# Altium footprint library Molex FFC - FPC Connectors (SMT).PcbLib: 638 footprints (part 6 of 40)
Each footprint in its own frame and in the unit in brackets; x right, y up, seen from the top. Pads: shape width x height; smd on the part's side, far side on the other; paste and mask are expansions set on the pad; w line width, h text height; cw(c..) or ccw(c..) is an arc to the next point about the centre after c.
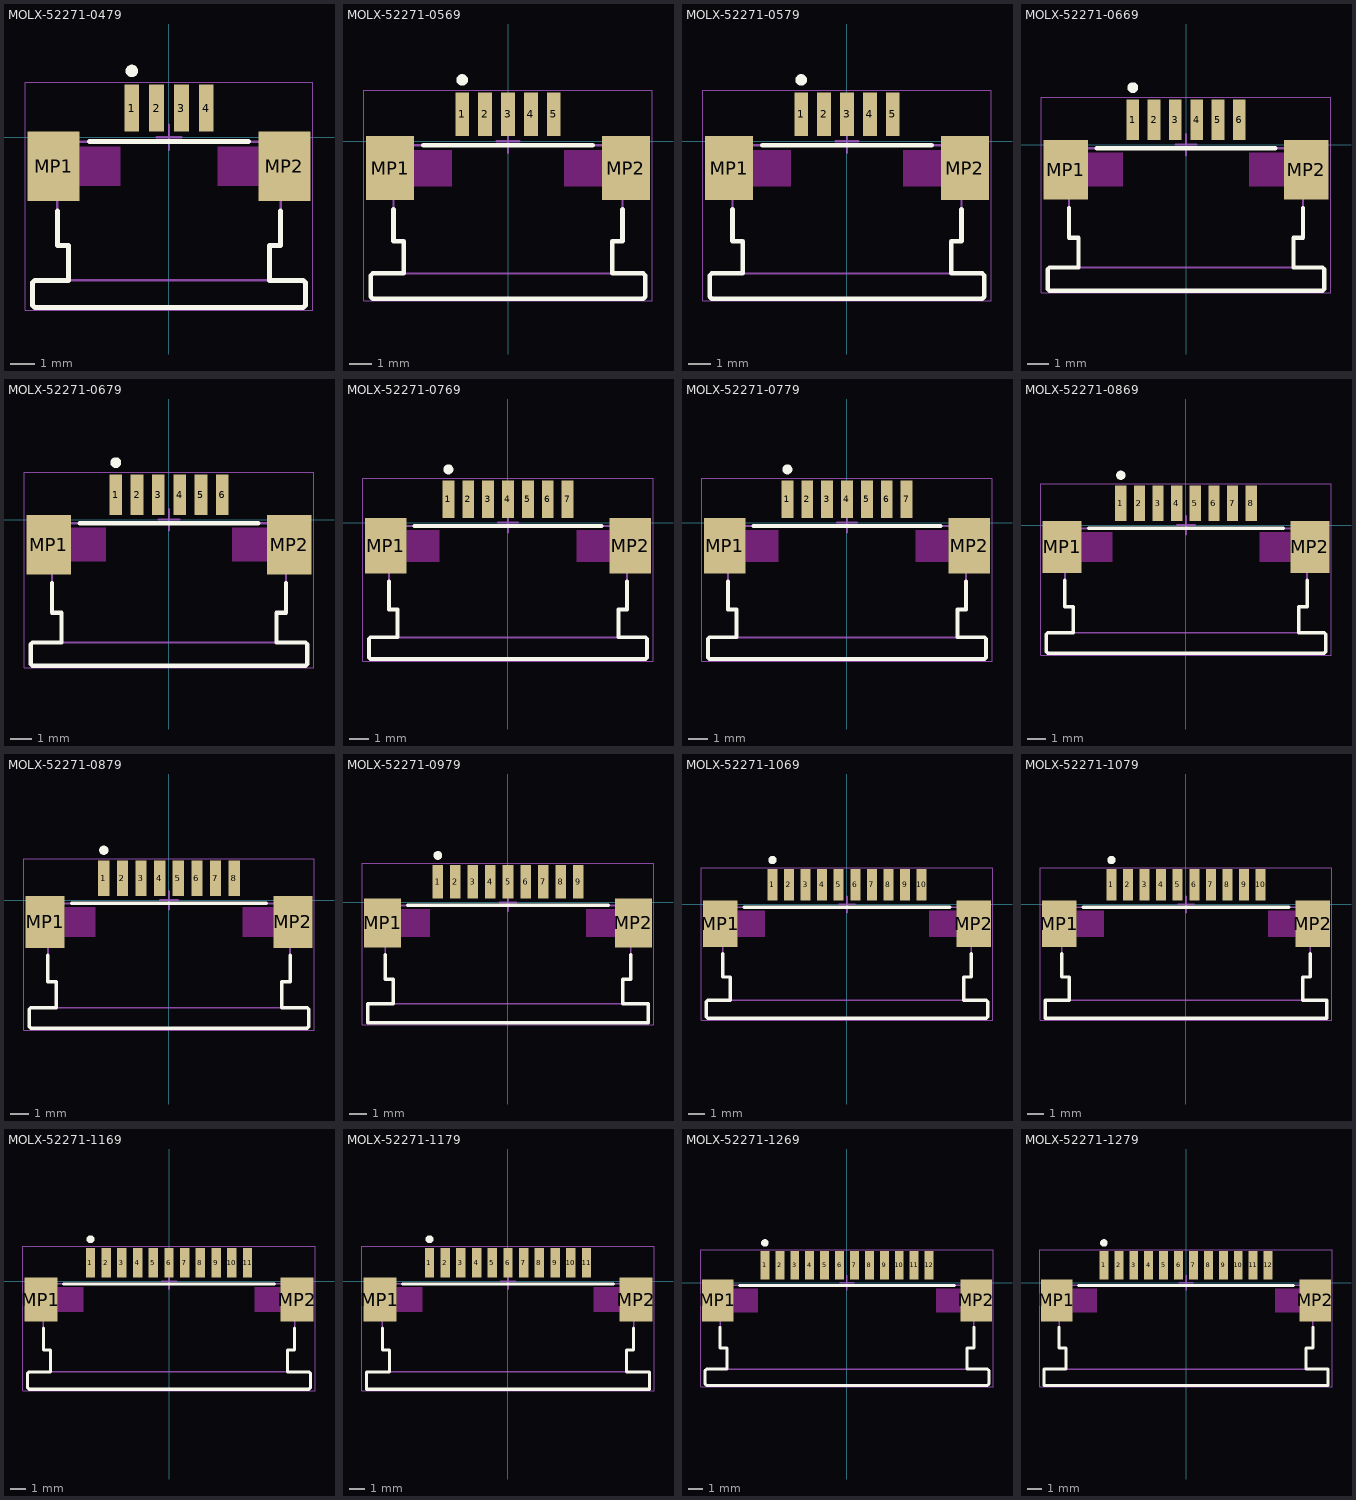
[diagram p5: the footprints below, top view; thin cyan lines are the x and y axes]

## MOLX-52271-0479 [mm] "FPC Connector, 4-Leads, Right Angle, Pitch 1.0 mm, Mated Height 3.0 mm, SMT"
height 3
pads (6):
  rect 0.6x1.9 smd: 1(-1.5,1.175) 2(-0.5,1.175) 3(0.5,1.175) 4(1.5,1.175)
  rect 2.1x2.8 smd: MP1(-4.65,-1.175) MP2(4.65,-1.175)
Top Overlay:
  circle w0.25: c-1.5,2.675 r0.125
  lines w0.2: -4.5,-2.975 -4.5,-4.375 -4.05,-4.375 -4.05,-5.775 -5.412,-5.775 -5.5,-5.863 -5.5,-6.787 -5.412,-6.875 5.412,-6.875 5.5,-6.787 5.5,-5.863 5.412,-5.775 4.05,-5.775 4.05,-4.375 4.5,-4.375 4.5,-2.975 ; -3.2,-0.175 3.2,-0.175
Keep-Out Layer:
  rectangle: -3.6,-1.975 -1.95,-0.375
  rectangle: 1.95,-1.975 3.6,-0.375
Mechanical 13:
  lines w0.1: -4.05,-5.775 -4.05,-4.375 -4.5,-4.375 -4.5,-0.175 4.5,-0.175 4.5,-4.375 4.05,-4.375 4.05,-5.775 ; -5.5,-6.787 -5.5,-5.863 -5.412,-5.775 5.412,-5.775 5.5,-5.863 5.5,-6.787 5.412,-6.875 -5.412,-6.875 -5.5,-6.787
Mechanical 15:
  lines w0.05: -5.8,-6.975 5.8,-6.975 5.8,2.225 -5.8,2.225 -5.8,-6.975
  lines w0.1: -0.5,0 0.5,0 ; 0,-0.5 0,0.5
3D body: height 0.25, standoff 0, extent -5.5,-6.875 5.5,1.825

## MOLX-52271-0569 [mm] "FPC Connector, 5-Leads, Right Angle, Pitch 1.0 mm, Mated Height 3.0 mm, SMT"
height 3.012
pads (7):
  rect 0.6x1.9 smd: 1(-2,1.175) 2(-1,1.175) 3(0,1.175) 4(1,1.175) 5(2,1.175)
  rect 2.1x2.8 smd: MP1(-5.15,-1.175) MP2(5.15,-1.175)
Top Overlay:
  circle w0.25: c-2,2.675 r0.125
  lines w0.2: -5,-2.975 -5,-4.375 -4.55,-4.375 -4.55,-5.775 -5.912,-5.775 -6,-5.863 -6,-6.787 -5.912,-6.875 5.912,-6.875 6,-6.787 6,-5.863 5.912,-5.775 4.55,-5.775 4.55,-4.375 5,-4.375 5,-2.975 ; -3.7,-0.175 3.7,-0.175
Keep-Out Layer:
  rectangle: -4.1,-1.975 -2.45,-0.375
  rectangle: 2.45,-1.975 4.1,-0.375
Mechanical 13:
  lines w0.1: -4.55,-5.775 -4.55,-4.375 -5,-4.375 -5,-0.175 5,-0.175 5,-4.375 4.55,-4.375 4.55,-5.775 ; -6,-6.787 -6,-5.863 -5.912,-5.775 5.912,-5.775 6,-5.863 6,-6.787 5.912,-6.875 -5.912,-6.875 -6,-6.787
Mechanical 15:
  lines w0.05: -6.3,-6.975 6.3,-6.975 6.3,2.225 -6.3,2.225 -6.3,-6.975
  lines w0.1: -0.5,0 0.5,0 ; 0,-0.5 0,0.5
3D body: height 0.25, standoff 0, extent -6,-6.875 6,1.825

## MOLX-52271-0579 [mm] "FPC Connector, 5-Leads, Right Angle, Pitch 1.0 mm, Mated Height 3.0 mm, SMT"
height 3.012
pads (7):
  rect 0.6x1.9 smd: 1(-2,1.175) 2(-1,1.175) 3(0,1.175) 4(1,1.175) 5(2,1.175)
  rect 2.1x2.8 smd: MP1(-5.15,-1.175) MP2(5.15,-1.175)
Top Overlay:
  circle w0.25: c-2,2.675 r0.125
  lines w0.2: -5,-2.975 -5,-4.375 -4.55,-4.375 -4.55,-5.775 -5.912,-5.775 -6,-5.863 -6,-6.787 -5.912,-6.875 5.912,-6.875 6,-6.787 6,-5.863 5.912,-5.775 4.55,-5.775 4.55,-4.375 5,-4.375 5,-2.975 ; -3.7,-0.175 3.7,-0.175
Keep-Out Layer:
  rectangle: 2.45,-1.975 4.1,-0.375
  rectangle: -4.1,-1.975 -2.45,-0.375
Mechanical 13:
  lines w0.1: -4.55,-5.775 -4.55,-4.375 -5,-4.375 -5,-0.175 5,-0.175 5,-4.375 4.55,-4.375 4.55,-5.775 ; -6,-6.787 -5.912,-6.875 5.912,-6.875 6,-6.787 6,-5.863 5.912,-5.775 -5.912,-5.775 -6,-5.863 -6,-6.787
Mechanical 15:
  lines w0.05: -6.3,-6.975 -6.3,2.225 6.3,2.225 6.3,-6.975 -6.3,-6.975
  lines w0.1: -0.5,0 0.5,0 ; 0,-0.5 0,0.5
3D body: height 0.25, standoff 0, extent -6,-6.875 6,1.825

## MOLX-52271-0669 [mm] "FPC Connector, 6-Leads, Right Angle, Pitch 1.0 mm, Mated Height 3.0 mm, SMT"
height 3.012
pads (8):
  rect 0.6x1.9 smd: 1(-2.5,1.175) 2(-1.5,1.175) 3(-0.5,1.175) 4(0.5,1.175) 5(1.5,1.175) 6(2.5,1.175)
  rect 2.1x2.8 smd: MP1(-5.65,-1.175) MP2(5.65,-1.175)
Top Overlay:
  circle w0.25: c-2.5,2.675 r0.125
  lines w0.2: -5.5,-2.975 -5.5,-4.375 -5.05,-4.375 -5.05,-5.775 -6.412,-5.775 -6.5,-5.863 -6.5,-6.787 -6.412,-6.875 6.412,-6.875 6.5,-6.787 6.5,-5.863 6.412,-5.775 5.05,-5.775 5.05,-4.375 5.5,-4.375 5.5,-2.975 ; -4.2,-0.175 4.2,-0.175
Keep-Out Layer:
  rectangle: 2.95,-1.975 4.6,-0.375
  rectangle: -4.6,-1.975 -2.95,-0.375
Mechanical 13:
  lines w0.1: -5.05,-5.775 -5.05,-4.375 -5.5,-4.375 -5.5,-0.175 5.5,-0.175 5.5,-4.375 5.05,-4.375 5.05,-5.775 ; -6.5,-6.787 -6.412,-6.875 6.412,-6.875 6.5,-6.787 6.5,-5.863 6.412,-5.775 -6.412,-5.775 -6.5,-5.863 -6.5,-6.787
Mechanical 15:
  lines w0.05: -6.8,-6.975 -6.8,2.225 6.8,2.225 6.8,-6.975 -6.8,-6.975
  lines w0.1: -0.5,0 0.5,0 ; 0,-0.5 0,0.5
3D body: height 0.25, standoff 0, extent -6.5,-6.875 6.5,1.825

## MOLX-52271-0679 [mm] "FPC Connector, 6-Leads, Right Angle, Pitch 1.0 mm, Mated Height 3.0 mm, SMT"
height 3.012
pads (8):
  rect 0.6x1.9 smd: 1(-2.5,1.175) 2(-1.5,1.175) 3(-0.5,1.175) 4(0.5,1.175) 5(1.5,1.175) 6(2.5,1.175)
  rect 2.1x2.8 smd: MP1(-5.65,-1.175) MP2(5.65,-1.175)
Top Overlay:
  circle w0.25: c-2.5,2.675 r0.125
  lines w0.2: -5.5,-2.975 -5.5,-4.375 -5.05,-4.375 -5.05,-5.775 -6.412,-5.775 -6.5,-5.863 -6.5,-6.787 -6.412,-6.875 6.412,-6.875 6.5,-6.787 6.5,-5.863 6.412,-5.775 5.05,-5.775 5.05,-4.375 5.5,-4.375 5.5,-2.975 ; -4.2,-0.175 4.2,-0.175
Keep-Out Layer:
  rectangle: 2.95,-1.975 4.6,-0.375
  rectangle: -4.6,-1.975 -2.95,-0.375
Mechanical 13:
  lines w0.1: -5.05,-5.775 -5.05,-4.375 -5.5,-4.375 -5.5,-0.175 5.5,-0.175 5.5,-4.375 5.05,-4.375 5.05,-5.775 ; -6.5,-6.787 -6.412,-6.875 6.412,-6.875 6.5,-6.787 6.5,-5.863 6.412,-5.775 -6.412,-5.775 -6.5,-5.863 -6.5,-6.787
Mechanical 15:
  lines w0.05: -6.8,-6.975 -6.8,2.225 6.8,2.225 6.8,-6.975 -6.8,-6.975
  lines w0.1: -0.5,0 0.5,0 ; 0,-0.5 0,0.5
3D body: height 0.25, standoff 0, extent -6.5,-6.875 6.5,1.825

## MOLX-52271-0769 [mm] "FPC Connector, 7-Leads, Right Angle, Pitch 1.0 mm, Mated Height 3.0 mm, SMT"
height 3.012
pads (9):
  rect 0.6x1.9 smd: 1(-3,1.175) 2(-2,1.175) 3(-1,1.175) 4(0,1.175) 5(1,1.175) 6(2,1.175) 7(3,1.175)
  rect 2.1x2.8 smd: MP1(-6.15,-1.175) MP2(6.15,-1.175)
Top Overlay:
  circle w0.25: c-3,2.675 r0.125
  lines w0.2: -6,-2.975 -6,-4.375 -5.55,-4.375 -5.55,-5.775 -6.912,-5.775 -7,-5.863 -7,-6.787 -6.912,-6.875 6.912,-6.875 7,-6.787 7,-5.863 6.912,-5.775 5.55,-5.775 5.55,-4.375 6,-4.375 6,-2.975 ; -4.7,-0.175 4.7,-0.175
Keep-Out Layer:
  rectangle: 3.45,-1.975 5.1,-0.375
  rectangle: -5.1,-1.975 -3.45,-0.375
Mechanical 13:
  lines w0.1: -5.55,-5.775 -5.55,-4.375 -6,-4.375 -6,-0.175 6,-0.175 6,-4.375 5.55,-4.375 5.55,-5.775 ; -7,-6.787 -6.912,-6.875 6.912,-6.875 7,-6.787 7,-5.863 6.912,-5.775 -6.912,-5.775 -7,-5.863 -7,-6.787
Mechanical 15:
  lines w0.05: -7.3,-6.975 -7.3,2.225 7.3,2.225 7.3,-6.975 -7.3,-6.975
  lines w0.1: -0.5,0 0.5,0 ; 0,-0.5 0,0.5
3D body: height 0.25, standoff 0, extent -7,-6.875 7,1.825

## MOLX-52271-0779 [mm] "FPC Connector, 7-Leads, Right Angle, Pitch 1.0 mm, Mated Height 3.0 mm, SMT"
height 3.012
pads (9):
  rect 0.6x1.9 smd: 1(-3,1.175) 2(-2,1.175) 3(-1,1.175) 4(0,1.175) 5(1,1.175) 6(2,1.175) 7(3,1.175)
  rect 2.1x2.8 smd: MP1(-6.15,-1.175) MP2(6.15,-1.175)
Top Overlay:
  circle w0.25: c-3,2.675 r0.125
  lines w0.2: -6,-2.975 -6,-4.375 -5.55,-4.375 -5.55,-5.775 -6.912,-5.775 -7,-5.863 -7,-6.787 -6.912,-6.875 6.912,-6.875 7,-6.787 7,-5.863 6.912,-5.775 5.55,-5.775 5.55,-4.375 6,-4.375 6,-2.975 ; -4.7,-0.175 4.7,-0.175
Keep-Out Layer:
  rectangle: 3.45,-1.975 5.1,-0.375
  rectangle: -5.1,-1.975 -3.45,-0.375
Mechanical 13:
  lines w0.1: -5.55,-5.775 -5.55,-4.375 -6,-4.375 -6,-0.175 6,-0.175 6,-4.375 5.55,-4.375 5.55,-5.775 ; -7,-6.787 -6.912,-6.875 6.912,-6.875 7,-6.787 7,-5.863 6.912,-5.775 -6.912,-5.775 -7,-5.863 -7,-6.787
Mechanical 15:
  lines w0.05: -7.3,-6.975 -7.3,2.225 7.3,2.225 7.3,-6.975 -7.3,-6.975
  lines w0.1: -0.5,0 0.5,0 ; 0,-0.5 0,0.5
3D body: height 0.25, standoff 0, extent -7,-6.875 7,1.825

## MOLX-52271-0869 [mm] "FPC Connector, 8-Leads, Right Angle, Pitch 1.0 mm, Mated Height 3.0 mm, SMT"
height 3.012
pads (10):
  rect 0.6x1.9 smd: 1(-3.5,1.175) 2(-2.5,1.175) 3(-1.5,1.175) 4(-0.5,1.175) 5(0.5,1.175) 6(1.5,1.175) 7(2.5,1.175) 8(3.5,1.175)
  rect 2.1x2.8 smd: MP1(-6.65,-1.175) MP2(6.65,-1.175)
Top Overlay:
  circle w0.25: c-3.5,2.675 r0.125
  lines w0.2: -6.5,-2.975 -6.5,-4.375 -6.05,-4.375 -6.05,-5.775 -7.412,-5.775 -7.5,-5.863 -7.5,-6.787 -7.412,-6.875 7.412,-6.875 7.5,-6.787 7.5,-5.863 7.412,-5.775 6.05,-5.775 6.05,-4.375 6.5,-4.375 6.5,-2.975 ; -5.2,-0.175 5.2,-0.175
Keep-Out Layer:
  rectangle: 3.95,-1.975 5.6,-0.375
  rectangle: -5.6,-1.975 -3.95,-0.375
Mechanical 13:
  lines w0.1: -6.05,-5.775 -6.05,-4.375 -6.5,-4.375 -6.5,-0.175 6.5,-0.175 6.5,-4.375 6.05,-4.375 6.05,-5.775 ; -7.5,-6.787 -7.412,-6.875 7.412,-6.875 7.5,-6.787 7.5,-5.863 7.412,-5.775 -7.412,-5.775 -7.5,-5.863 -7.5,-6.787
Mechanical 15:
  lines w0.05: -7.8,-6.975 -7.8,2.225 7.8,2.225 7.8,-6.975 -7.8,-6.975
  lines w0.1: -0.5,0 0.5,0 ; 0,-0.5 0,0.5
3D body: height 0.25, standoff 0, extent -7.5,-6.875 7.5,1.825

## MOLX-52271-0879 [mm] "FPC Connector, 8-Leads, Right Angle, Pitch 1.0 mm, Mated Height 3.0 mm, SMT"
height 3.012
pads (10):
  rect 0.6x1.9 smd: 1(-3.5,1.175) 2(-2.5,1.175) 3(-1.5,1.175) 4(-0.5,1.175) 5(0.5,1.175) 6(1.5,1.175) 7(2.5,1.175) 8(3.5,1.175)
  rect 2.1x2.8 smd: MP1(-6.65,-1.175) MP2(6.65,-1.175)
Top Overlay:
  circle w0.25: c-3.5,2.675 r0.125
  lines w0.2: -6.5,-2.975 -6.5,-4.375 -6.05,-4.375 -6.05,-5.775 -7.412,-5.775 -7.5,-5.863 -7.5,-6.787 -7.412,-6.875 7.412,-6.875 7.5,-6.787 7.5,-5.863 7.412,-5.775 6.05,-5.775 6.05,-4.375 6.5,-4.375 6.5,-2.975 ; -5.2,-0.175 5.2,-0.175
Keep-Out Layer:
  rectangle: 3.95,-1.975 5.6,-0.375
  rectangle: -5.6,-1.975 -3.95,-0.375
Mechanical 13:
  lines w0.1: -6.05,-5.775 -6.05,-4.375 -6.5,-4.375 -6.5,-0.175 6.5,-0.175 6.5,-4.375 6.05,-4.375 6.05,-5.775 ; -7.5,-6.787 -7.412,-6.875 7.412,-6.875 7.5,-6.787 7.5,-5.863 7.412,-5.775 -7.412,-5.775 -7.5,-5.863 -7.5,-6.787
Mechanical 15:
  lines w0.05: -7.8,-6.975 -7.8,2.225 7.8,2.225 7.8,-6.975 -7.8,-6.975
  lines w0.1: -0.5,0 0.5,0 ; 0,-0.5 0,0.5
3D body: height 0.25, standoff 0, extent -7.5,-6.875 7.5,1.825

## MOLX-52271-0979 [mm] "FPC Connector, 9-Leads, Right Angle, Pitch 1.0 mm, Mated Height 3.0 mm, SMT"
height 3.012
pads (11):
  rect 0.6x1.9 smd: 1(-4,1.175) 2(-3,1.175) 3(-2,1.175) 4(-1,1.175) 5(0,1.175) 6(1,1.175) 7(2,1.175) 8(3,1.175) 9(4,1.175)
  rect 2.1x2.8 smd: MP1(-7.15,-1.175) MP2(7.15,-1.175)
Top Overlay:
  circle w0.25: c-4,2.675 r0.125
  lines w0.2: -7,-2.975 -7,-4.375 -6.55,-4.375 -6.55,-5.775 -8,-5.775 -8,-6.875 8,-6.875 8,-5.775 6.55,-5.775 6.55,-4.375 7,-4.375 7,-2.975 ; -5.7,-0.175 5.7,-0.175
Keep-Out Layer:
  rectangle: 4.45,-1.975 6.1,-0.375
  region: -4.45,-0.375 -6.1,-0.375 -6.1,-1.975 -4.45,-1.975
Mechanical 13:
  lines w0.1: -6.55,-5.775 -6.55,-4.375 -7,-4.375 -7,-0.175 7,-0.175 7,-4.375 6.55,-4.375 6.55,-5.775 ; -8,-6.875 -8,-5.775 8,-5.775 8,-6.875 -8,-6.875
Mechanical 15:
  lines w0.05: -8.3,-6.975 8.3,-6.975 8.3,2.225 -8.3,2.225 -8.3,-6.975
  lines w0.1: -0.5,0 0.5,0 ; 0,-0.5 0,0.5
3D body: height 0.25, standoff 0, extent -8,-6.875 8,1.825

## MOLX-52271-1069 [mm] "FPC Connector, 10-Leads, Right Angle, Pitch 1.0 mm, Mated Height 3.0 mm, SMT"
height 3.012
pads (12):
  rect 0.6x1.9 smd: 1(-4.5,1.175) 2(-3.5,1.175) 3(-2.5,1.175) 4(-1.5,1.175) 5(-0.5,1.175) 6(0.5,1.175) 7(1.5,1.175) 8(2.5,1.175) 9(3.5,1.175) 10(4.5,1.175)
  rect 2.1x2.8 smd: MP1(-7.65,-1.175) MP2(7.65,-1.175)
Top Overlay:
  circle w0.25: c-4.5,2.675 r0.125
  lines w0.2: -7.5,-2.975 -7.5,-4.375 -7.05,-4.375 -7.05,-5.775 -8.412,-5.775 -8.5,-5.863 -8.5,-6.787 -8.412,-6.875 8.412,-6.875 8.5,-6.787 8.5,-5.863 8.412,-5.775 7.05,-5.775 7.05,-4.375 7.5,-4.375 7.5,-2.975 ; -6.2,-0.175 6.2,-0.175
Keep-Out Layer:
  rectangle: 4.95,-1.975 6.6,-0.375
  rectangle: -6.6,-1.975 -4.95,-0.375
Mechanical 13:
  lines w0.1: -7.05,-5.775 -7.05,-4.375 -7.5,-4.375 -7.5,-0.175 7.5,-0.175 7.5,-4.375 7.05,-4.375 7.05,-5.775 ; -8.5,-6.787 -8.412,-6.875 8.412,-6.875 8.5,-6.787 8.5,-5.863 8.412,-5.775 -8.412,-5.775 -8.5,-5.863 -8.5,-6.787
Mechanical 15:
  lines w0.05: -8.8,-6.975 -8.8,2.225 8.8,2.225 8.8,-6.975 -8.8,-6.975
  lines w0.1: -0.5,0 0.5,0 ; 0,-0.5 0,0.5
3D body: height 0.25, standoff 0, extent -8.5,-6.875 8.5,1.825

## MOLX-52271-1079 [mm] "FPC Connector, 10-Leads, Right Angle, Pitch 1.0 mm, Mated Height 3.0 mm, SMT"
height 3.012
pads (12):
  rect 0.6x1.9 smd: 1(-4.5,1.175) 2(-3.5,1.175) 3(-2.5,1.175) 4(-1.5,1.175) 5(-0.5,1.175) 6(0.5,1.175) 7(1.5,1.175) 8(2.5,1.175) 9(3.5,1.175) 10(4.5,1.175)
  rect 2.1x2.8 smd: MP1(-7.65,-1.175) MP2(7.65,-1.175)
Top Overlay:
  circle w0.25: c-4.5,2.675 r0.125
  lines w0.2: -7.5,-2.975 -7.5,-4.375 -7.05,-4.375 -7.05,-5.775 -8.5,-5.775 -8.5,-6.875 8.5,-6.875 8.5,-5.775 7.05,-5.775 7.05,-4.375 7.5,-4.375 7.5,-2.975 ; -6.2,-0.175 6.2,-0.175
Keep-Out Layer:
  region: -4.95,-0.375 -6.6,-0.375 -6.6,-1.975 -4.95,-1.975
  rectangle: 4.95,-1.975 6.6,-0.375
Mechanical 13:
  lines w0.1: -7.05,-5.775 -7.05,-4.375 -7.5,-4.375 -7.5,-0.175 7.5,-0.175 7.5,-4.375 7.05,-4.375 7.05,-5.775 ; -8.5,-6.875 8.5,-6.875 8.5,-5.775 -8.5,-5.775 -8.5,-6.875
Mechanical 15:
  lines w0.05: -8.8,-6.975 -8.8,2.225 8.8,2.225 8.8,-6.975 -8.8,-6.975
  lines w0.1: -0.5,0 0.5,0 ; 0,-0.5 0,0.5
3D body: height 0.25, standoff 0, extent -8.5,-6.875 8.5,1.825

## MOLX-52271-1169 [mm] "FPC Connector, 11-Leads, Right Angle, Pitch 1.0 mm, Mated Height 3.0 mm, SMT"
height 3.012
pads (13):
  rect 0.6x1.9 smd: 1(-5,1.175) 2(-4,1.175) 3(-3,1.175) 4(-2,1.175) 5(-1,1.175) 6(0,1.175) 7(1,1.175) 8(2,1.175) 9(3,1.175) 10(4,1.175) 11(5,1.175)
  rect 2.1x2.8 smd: MP1(-8.15,-1.175) MP2(8.15,-1.175)
Top Overlay:
  circle w0.25: c-5,2.675 r0.125
  lines w0.2: -8,-2.975 -8,-4.375 -7.55,-4.375 -7.55,-5.775 -8.912,-5.775 -9,-5.863 -9,-6.787 -8.912,-6.875 8.912,-6.875 9,-6.787 9,-5.863 8.912,-5.775 7.55,-5.775 7.55,-4.375 8,-4.375 8,-2.975 ; -6.7,-0.175 6.7,-0.175
Keep-Out Layer:
  rectangle: -7.1,-1.975 -5.45,-0.375
  rectangle: 5.45,-1.975 7.1,-0.375
Mechanical 13:
  lines w0.1: -7.55,-5.775 -7.55,-4.375 -8,-4.375 -8,-0.175 8,-0.175 8,-4.375 7.55,-4.375 7.55,-5.775 ; -9,-6.787 -9,-5.863 -8.912,-5.775 8.912,-5.775 9,-5.863 9,-6.787 8.912,-6.875 -8.912,-6.875 -9,-6.787
Mechanical 15:
  lines w0.05: -9.3,-6.975 9.3,-6.975 9.3,2.225 -9.3,2.225 -9.3,-6.975
  lines w0.1: -0.5,0 0.5,0 ; 0,-0.5 0,0.5
3D body: height 0.25, standoff 0, extent -9,-6.875 9,1.825

## MOLX-52271-1179 [mm] "FPC Connector, 11-Leads, Right Angle, Pitch 1.0 mm, Mated Height 3.0 mm, SMT"
height 3.012
pads (13):
  rect 0.6x1.9 smd: 1(-5,1.175) 2(-4,1.175) 3(-3,1.175) 4(-2,1.175) 5(-1,1.175) 6(0,1.175) 7(1,1.175) 8(2,1.175) 9(3,1.175) 10(4,1.175) 11(5,1.175)
  rect 2.1x2.8 smd: MP1(-8.15,-1.175) MP2(8.15,-1.175)
Top Overlay:
  circle w0.25: c-5,2.675 r0.125
  lines w0.2: -8,-2.975 -8,-4.375 -7.55,-4.375 -7.55,-5.775 -9,-5.775 -9,-6.875 9,-6.875 9,-5.775 7.55,-5.775 7.55,-4.375 8,-4.375 8,-2.975 ; -6.7,-0.175 6.7,-0.175
Keep-Out Layer:
  rectangle: 5.45,-1.975 7.1,-0.375
  region: -5.45,-0.375 -7.1,-0.375 -7.1,-1.975 -5.45,-1.975
Mechanical 13:
  lines w0.1: -7.55,-5.775 -7.55,-4.375 -8,-4.375 -8,-0.175 8,-0.175 8,-4.375 7.55,-4.375 7.55,-5.775 ; -9,-6.875 -9,-5.775 9,-5.775 9,-6.875 -9,-6.875
Mechanical 15:
  lines w0.05: -9.3,-6.975 9.3,-6.975 9.3,2.225 -9.3,2.225 -9.3,-6.975
  lines w0.1: -0.5,0 0.5,0 ; 0,-0.5 0,0.5
3D body: height 0.25, standoff 0, extent -9,-6.875 9,1.825

## MOLX-52271-1269 [mm] "FPC Connector, 12-Leads, Right Angle, Pitch 1.0 mm, Mated Height 3.0 mm, SMT"
height 3.012
pads (14):
  rect 0.6x1.9 smd: 1(-5.5,1.175) 2(-4.5,1.175) 3(-3.5,1.175) 4(-2.5,1.175) 5(-1.5,1.175) 6(-0.5,1.175) 7(0.5,1.175) 8(1.5,1.175) 9(2.5,1.175) 10(3.5,1.175) 11(4.5,1.175) 12(5.5,1.175)
  rect 2.1x2.8 smd: MP1(-8.65,-1.175) MP2(8.65,-1.175)
Top Overlay:
  circle w0.25: c-5.5,2.675 r0.125
  lines w0.2: -8.5,-2.975 -8.5,-4.375 -8.05,-4.375 -8.05,-5.775 -9.412,-5.775 -9.5,-5.863 -9.5,-6.787 -9.412,-6.875 9.412,-6.875 9.5,-6.787 9.5,-5.863 9.412,-5.775 8.05,-5.775 8.05,-4.375 8.5,-4.375 8.5,-2.975 ; -7.2,-0.175 7.2,-0.175
Keep-Out Layer:
  rectangle: -7.6,-1.975 -5.95,-0.375
  rectangle: 5.95,-1.975 7.6,-0.375
Mechanical 13:
  lines w0.1: -8.05,-5.775 -8.05,-4.375 -8.5,-4.375 -8.5,-0.175 8.5,-0.175 8.5,-4.375 8.05,-4.375 8.05,-5.775 ; -9.5,-6.787 -9.5,-5.863 -9.412,-5.775 9.412,-5.775 9.5,-5.863 9.5,-6.787 9.412,-6.875 -9.412,-6.875 -9.5,-6.787
Mechanical 15:
  lines w0.05: -9.8,-6.975 9.8,-6.975 9.8,2.225 -9.8,2.225 -9.8,-6.975
  lines w0.1: -0.5,0 0.5,0 ; 0,-0.5 0,0.5
3D body: height 0.25, standoff 0, extent -9.5,-6.875 9.5,1.825

## MOLX-52271-1279 [mm] "FPC Connector, 12-Leads, Right Angle, Pitch 1.0 mm, Mated Height 3.0 mm, SMT"
height 3.012
pads (14):
  rect 0.6x1.9 smd: 1(-5.5,1.175) 2(-4.5,1.175) 3(-3.5,1.175) 4(-2.5,1.175) 5(-1.5,1.175) 6(-0.5,1.175) 7(0.5,1.175) 8(1.5,1.175) 9(2.5,1.175) 10(3.5,1.175) 11(4.5,1.175) 12(5.5,1.175)
  rect 2.1x2.8 smd: MP1(-8.65,-1.175) MP2(8.65,-1.175)
Top Overlay:
  circle w0.25: c-5.5,2.675 r0.125
  lines w0.2: -8.5,-2.975 -8.5,-4.375 -8.05,-4.375 -8.05,-5.775 -9.5,-5.775 -9.5,-6.875 9.5,-6.875 9.5,-5.775 8.05,-5.775 8.05,-4.375 8.5,-4.375 8.5,-2.975 ; -7.2,-0.175 7.2,-0.175
Keep-Out Layer:
  rectangle: 5.95,-1.975 7.6,-0.375
  region: -5.95,-0.375 -7.6,-0.375 -7.6,-1.975 -5.95,-1.975
Mechanical 13:
  lines w0.1: -8.05,-5.775 -8.05,-4.375 -8.5,-4.375 -8.5,-0.175 8.5,-0.175 8.5,-4.375 8.05,-4.375 8.05,-5.775 ; -9.5,-6.875 -9.5,-5.775 9.5,-5.775 9.5,-6.875 -9.5,-6.875
Mechanical 15:
  lines w0.05: -9.8,-6.975 9.8,-6.975 9.8,2.225 -9.8,2.225 -9.8,-6.975
  lines w0.1: -0.5,0 0.5,0 ; 0,-0.5 0,0.5
3D body: height 0.25, standoff 0, extent -9.5,-6.875 9.5,1.825